# Altium footprint library SMD_Bauteile.PcbLib: 355 footprints (part 14 of 23)
Each footprint in its own frame and in the unit in brackets; x right, y up, seen from the top. Pads: shape width x height; smd on the part's side, far side on the other; paste and mask are expansions set on the pad; w line width, h text height; cw(c..) or ccw(c..) is an arc to the next point about the centre after c.
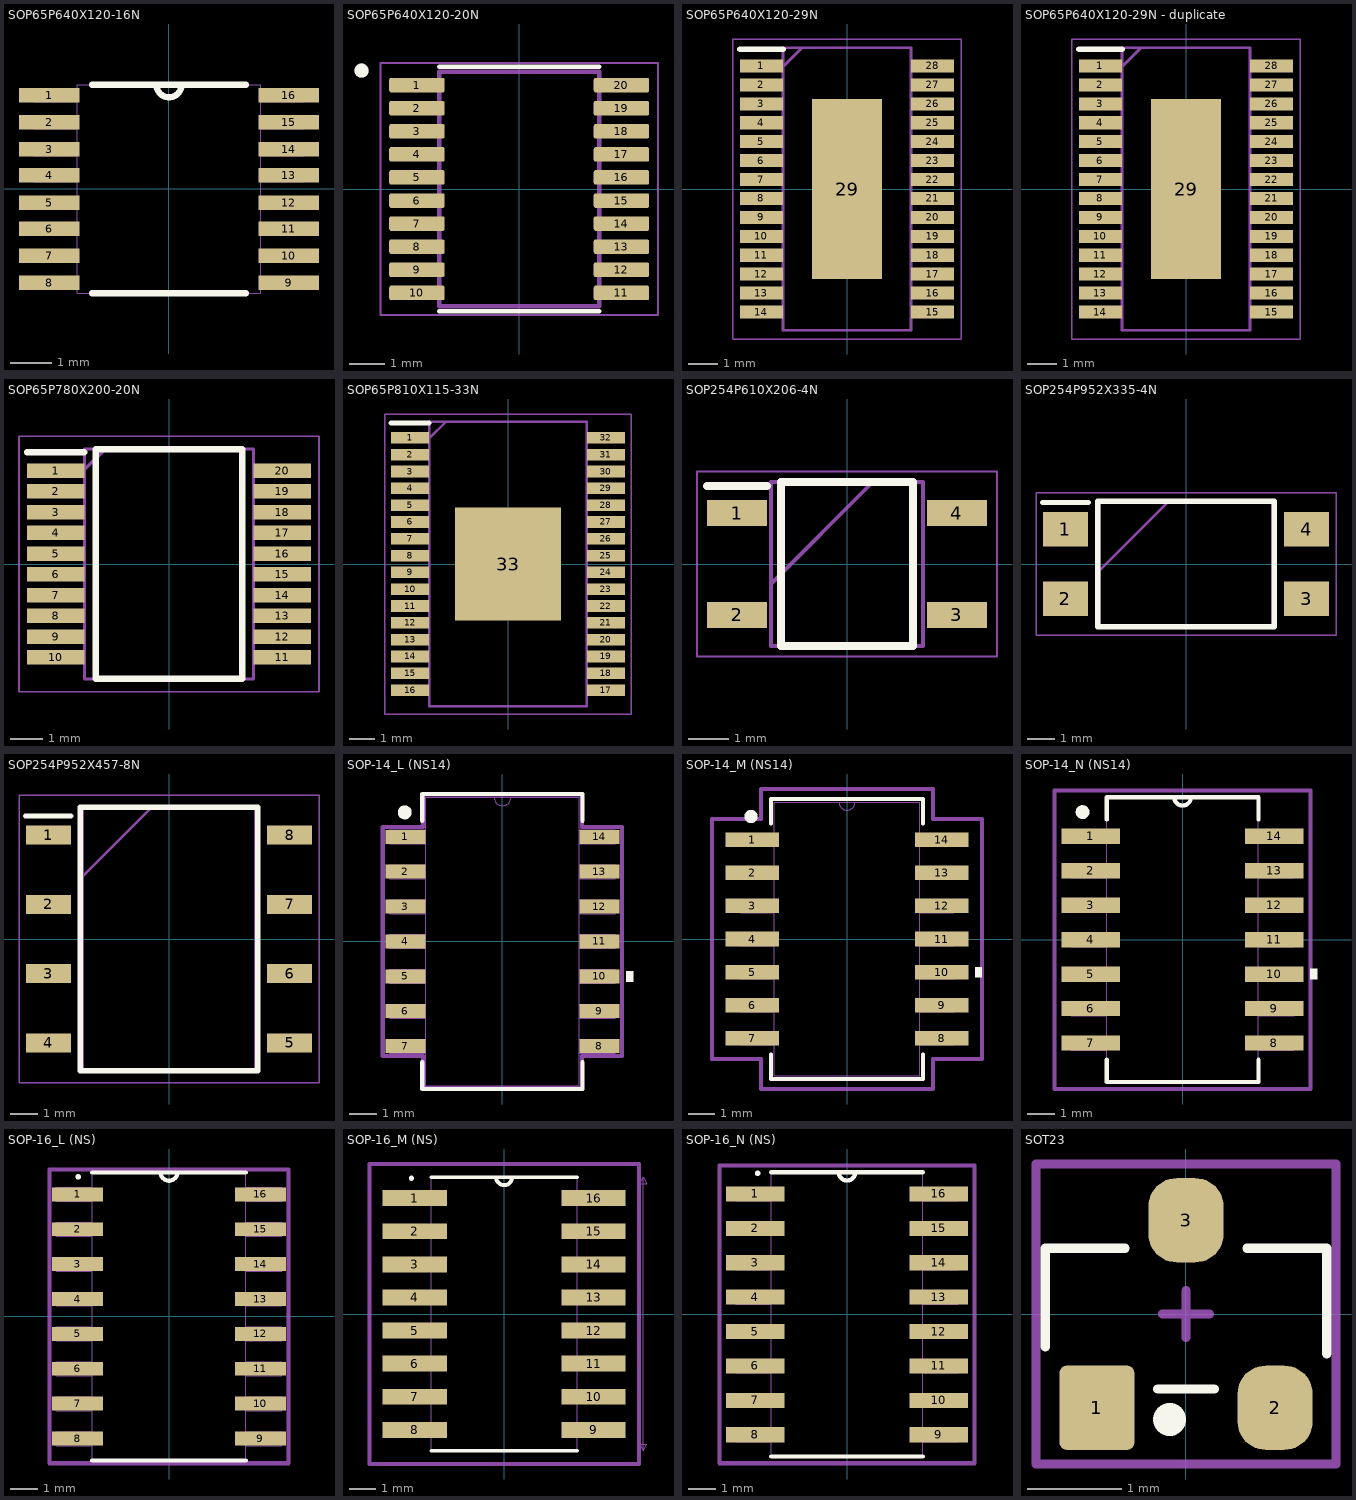
[diagram p13: the footprints below, top view; thin cyan lines are the x and y axes]

## SOP65P640X120-16N [mil]
pads (16):
  rect 58x14 smd: 1(-115,90) 2(-115,64) 3(-115,38) 4(-115,13) 5(-115,-13) 6(-115,-38) 7(-115,-64) 8(-115,-90) 9(115,-90) 10(115,-64) 11(115,-38) 12(115,-13) 13(115,13) 14(115,38) 15(115,64) 16(115,90)
Top Overlay:
  lines w6: -74,-100 74,-100 ; -74,100 -12,100 ; 74,100 12,100 ; -12,100 ccw(c0,100) 12,100 ; -12,100 12,100
Mech Misc 1:
  lines w0: -130,-95 -88,-95 ; -130,-95 -130,-84 ; -130,-95 -88,-95 ; -130,-95 -130,-84 ; -130,-84 -88,-84 ; -130,-84 -88,-84 ; -130,-70 -88,-70 ; -130,-70 -130,-58 ; -130,-70 -88,-70 ; -130,-70 -130,-58 ; -130,-58 -88,-58 ; -130,-58 -88,-58 ; -130,-44 -88,-44 ; -130,-44 -130,-32 ; -130,-44 -88,-44 ; -130,-44 -130,-32 ; -130,-32 -88,-32 ; -130,-32 -88,-32 ; -130,-19 -88,-19 ; -130,-19 -130,-7 ; -130,-19 -88,-19 ; -130,-19 -130,-7 ; -130,-7 -88,-7 ; -130,-7 -88,-7 ; -130,7 -88,7 ; -130,7 -130,19 ; -130,7 -88,7 ; -130,7 -130,19 ; -130,19 -88,19 ; -130,19 -88,19 ; -130,32 -88,32 ; -130,32 -130,44 ; -130,32 -88,32 ; -130,32 -130,44 ; -130,44 -88,44 ; -130,44 -88,44 ; -130,58 -88,58 ; -130,58 -130,70 ; -130,58 -88,58 ; -130,58 -130,70 ; -130,70 -88,70 ; -130,70 -88,70 ; -130,84 -88,84 ; -130,84 -130,95 ; -130,84 -88,84 ; -130,84 -130,95 ; -130,95 -88,95 ; -130,95 -88,95 ; -88,-100 -88,100 ; -88,-100 88,-100 ; -88,-100 -88,100 ; -88,-100 88,-100 ; -88,-95 -88,-84 ; -88,-95 -88,-84 ; -88,-70 -88,-58 ; -88,-70 -88,-58 ; -88,-44 -88,-32 ; -88,-44 -88,-32 ; -88,-19 -88,-7 ; -88,-19 -88,-7 ; -88,7 -88,19 ; -88,7 -88,19 ; -88,32 -88,44 ; -88,32 -88,44 ; -88,58 -88,70 ; -88,58 -88,70 ; -88,84 -88,95 ; -88,84 -88,95 ; -88,100 -12,100 ; -88,100 -12,100 ; -12,100 ccw(c0,100) 12,100 ; -12,100 ccw(c0,100) 12,100 ; -12,100 12,100 ; -12,100 12,100 ; 12,100 88,100 ; 12,100 88,100 ; 88,-100 88,100 ; 88,-100 88,100 ; 88,-95 130,-95 ; 88,-95 88,-84 ; 88,-95 130,-95 ; 88,-95 88,-84 ; 88,-84 130,-84 ; 88,-84 130,-84 ; 88,-70 130,-70 ; 88,-70 88,-58 ; 88,-70 130,-70 ; 88,-70 88,-58 ; 88,-58 130,-58 ; 88,-58 130,-58 ; 88,-44 130,-44 ; 88,-44 88,-32 ; 88,-44 130,-44 ; 88,-44 88,-32 ; 88,-32 130,-32 ; 88,-32 130,-32 ; 88,-19 130,-19 ; 88,-19 88,-7 ; 88,-19 130,-19 ; 88,-19 88,-7 ; 88,-7 130,-7 ; 88,-7 130,-7 ; 88,7 130,7 ; 88,7 88,19 ; 88,7 130,7 ; 88,7 88,19 ; 88,19 130,19 ; 88,19 130,19 ; 88,32 130,32 ; 88,32 88,44 ; 88,32 130,32 ; 88,32 88,44 ; 88,44 130,44 ; 88,44 130,44 ; 88,58 130,58 ; 88,58 88,70 ; 88,58 130,58 ; 88,58 88,70 ; 88,70 130,70 ; 88,70 130,70 ; 88,84 130,84 ; 88,84 88,95 ; 88,84 130,84 ; 88,84 88,95 ; 88,95 130,95 ; 88,95 130,95 ; 130,-95 130,-84 ; 130,-95 130,-84 ; 130,-70 130,-58 ; 130,-70 130,-58 ; 130,-44 130,-32 ; 130,-44 130,-32 ; 130,-19 130,-7 ; 130,-19 130,-7 ; 130,7 130,19 ; 130,7 130,19 ; 130,32 130,44 ; 130,32 130,44 ; 130,58 130,70 ; 130,58 130,70 ; 130,84 130,95 ; 130,84 130,95

## SOP65P640X120-20N [mm]
pads (20):
  rrect25% 1.56x0.41 smd: 1(-2.88,2.925) 2(-2.88,2.275) 3(-2.88,1.625) 4(-2.88,0.975) 5(-2.88,0.325) 6(-2.88,-0.325) 7(-2.88,-0.975) 8(-2.88,-1.625) 9(-2.88,-2.275) 10(-2.88,-2.925) 11(2.88,-2.925) 12(2.88,-2.275) 13(2.88,-1.625) 14(2.88,-0.975) 15(2.88,-0.325) 16(2.88,0.325) 17(2.88,0.975) 18(2.88,1.625) 19(2.88,2.275) 20(2.88,2.925)
Top Overlay:
  circle w0.2: c-4.44,3.335 r0.1
  lines w0.127: -2.25,-3.45 2.25,-3.45 ; -2.25,3.45 2.25,3.45
Mech Misc 1:
  circle w0.2: c-4.44,3.335 r0.1
  lines w0.127: -2.25,-3.3 -2.25,3.3 2.25,3.3 2.25,-3.3 -2.25,-3.3
Mech 15:
  lines w0.05: -3.91,-3.55 -3.91,3.55 3.91,3.55 3.91,-3.55 -3.91,-3.55
3D body "step_temp.STEP": height 1.2, standoff 0, extent -3.2,-3.25 3.2,3.25

## SOP65P640X120-29N [mm]
pads (29):
  rect 1.475x0.45 smd: 1(-2.938,4.225) 2(-2.938,3.575) 3(-2.938,2.925) 4(-2.938,2.275) 5(-2.938,1.625) 6(-2.938,0.975) 7(-2.938,0.325) 8(-2.938,-0.325) 9(-2.938,-0.975) 10(-2.938,-1.625) 11(-2.938,-2.275) 12(-2.938,-2.925) 13(-2.938,-3.575) 14(-2.938,-4.225) 15(2.938,-4.225) 16(2.938,-3.575) 17(2.938,-2.925) 18(2.938,-2.275) 19(2.938,-1.625) 20(2.938,-0.975) 21(2.938,-0.325) 22(2.938,0.325) 23(2.938,0.975) 24(2.938,1.625) 25(2.938,2.275) 26(2.938,2.925) 27(2.938,3.575) 28(2.938,4.225)
  rect 2.4x6.17 smd: 29(0,0)
Top Overlay:
  lines w0.2: -3.675,4.8 -2.2,4.8
Mech 15:
  lines w0.1: -2.2,4.2 -1.55,4.85 ; -2.2,-4.85 2.2,-4.85 2.2,4.85 -2.2,4.85 -2.2,-4.85
Top 3D Body:
  lines w0.05: -3.925,-5.15 3.925,-5.15 3.925,5.15 -3.925,5.15 -3.925,-5.15

## SOP65P640X120-29N - duplicate [mm]
pads (29):
  rect 1.475x0.45 smd: 1(-2.938,4.225) 2(-2.938,3.575) 3(-2.938,2.925) 4(-2.938,2.275) 5(-2.938,1.625) 6(-2.938,0.975) 7(-2.938,0.325) 8(-2.938,-0.325) 9(-2.938,-0.975) 10(-2.938,-1.625) 11(-2.938,-2.275) 12(-2.938,-2.925) 13(-2.938,-3.575) 14(-2.938,-4.225) 15(2.938,-4.225) 16(2.938,-3.575) 17(2.938,-2.925) 18(2.938,-2.275) 19(2.938,-1.625) 20(2.938,-0.975) 21(2.938,-0.325) 22(2.938,0.325) 23(2.938,0.975) 24(2.938,1.625) 25(2.938,2.275) 26(2.938,2.925) 27(2.938,3.575) 28(2.938,4.225)
  rect 2.4x6.17 smd: 29(0,0)
Top Overlay:
  lines w0.2: -3.675,4.8 -2.2,4.8
Mech 15:
  lines w0.1: -2.2,4.2 -1.55,4.85 ; -2.2,-4.85 2.2,-4.85 2.2,4.85 -2.2,4.85 -2.2,-4.85
Top 3D Body:
  lines w0.05: -3.925,-5.15 3.925,-5.15 3.925,5.15 -3.925,5.15 -3.925,-5.15

## SOP65P780X200-20N [mm]
pads (20):
  rect 1.8x0.45 smd: 1(-3.55,2.925) 2(-3.55,2.275) 3(-3.55,1.625) 4(-3.55,0.975) 5(-3.55,0.325) 6(-3.55,-0.325) 7(-3.55,-0.975) 8(-3.55,-1.625) 9(-3.55,-2.275) 10(-3.55,-2.925) 11(3.55,-2.925) 12(3.55,-2.275) 13(3.55,-1.625) 14(3.55,-0.975) 15(3.55,-0.325) 16(3.55,0.325) 17(3.55,0.975) 18(3.55,1.625) 19(3.55,2.275) 20(3.55,2.925)
Top Overlay:
  lines w0.2: -4.45,3.5 -2.65,3.5 ; -2.3,-3.6 -2.3,3.6 2.3,3.6 2.3,-3.6 -2.3,-3.6
Mech 15:
  lines w0.1: -2.65,2.95 -2,3.6 ; -2.65,-3.6 -2.65,3.6 2.65,3.6 2.65,-3.6 -2.65,-3.6
Top 3D Body:
  lines w0.05: -4.7,-4 -4.7,4 4.7,4 4.7,-4 -4.7,-4

## SOP65P810X115-33N [mm]
pads (33):
  rect 1.475x0.45 smd: 1(-3.788,4.875) 2(-3.788,4.225) 3(-3.788,3.575) 4(-3.788,2.925) 5(-3.788,2.275) 6(-3.788,1.625) 7(-3.788,0.975) 8(-3.788,0.325) 9(-3.788,-0.325) 10(-3.788,-0.975) 11(-3.788,-1.625) 12(-3.788,-2.275) 13(-3.788,-2.925) 14(-3.788,-3.575) 15(-3.788,-4.225) 16(-3.788,-4.875) 17(3.788,-4.875) 18(3.788,-4.225) 19(3.788,-3.575) 20(3.788,-2.925) 21(3.788,-2.275) 22(3.788,-1.625) 23(3.788,-0.975) 24(3.788,-0.325) 25(3.788,0.325) 26(3.788,0.975) 27(3.788,1.625) 28(3.788,2.275) 29(3.788,2.925) 30(3.788,3.575) 31(3.788,4.225) 32(3.788,4.875)
  rect 4.11x4.36 smd: 33(0,0)
Top Overlay:
  lines w0.2: -4.525,5.45 -3.05,5.45
Mech 15:
  lines w0.1: -3.05,4.85 -2.4,5.5 ; -3.05,-5.5 3.05,-5.5 3.05,5.5 -3.05,5.5 -3.05,-5.5
Top 3D Body:
  lines w0.05: -4.775,-5.8 4.775,-5.8 4.775,5.8 -4.775,5.8 -4.775,-5.8

## SOP254P610X206-4N [mm]
pads (4):
  rect 1.5x0.65 smd: 1(-2.75,1.27) 2(-2.75,-1.27) 3(2.75,-1.27) 4(2.75,1.27)
Top Overlay:
  lines w0.2: -3.5,1.945 -2,1.945 ; -1.65,-2.044 1.65,-2.044 1.65,2.044 -1.65,2.044 -1.65,-2.044
Mech Misc 1:
  lines w0.1: -1.905,-0.496 0.635,2.044 ; -1.905,-2.044 1.905,-2.044 1.905,2.044 -1.905,2.044 -1.905,-2.044
Mech 15:
  lines w0.05: -3.75,-2.307 3.75,-2.307 3.75,2.307 -3.75,2.307 -3.75,-2.307
3D body "CPC1002N.stp": height 2.05, standoff 0, extent -3.048,-2.044 3.048,2.044

## SOP254P952X335-4N [mm]
pads (4):
  rect 1.65x1.25 smd: 1(-4.4,1.27) 2(-4.4,-1.27) 3(4.4,-1.27) 4(4.4,1.27)
Top Overlay:
  lines w0.2: -5.225,2.245 -3.575,2.245 ; -3.225,-2.286 3.225,-2.286 3.225,2.286 -3.225,2.286 -3.225,-2.286
Mech Misc 1:
  lines w0.1: -3.175,-0.254 -0.635,2.286 ; -3.175,-2.286 3.175,-2.286 3.175,2.286 -3.175,2.286 -3.175,-2.286
Mech 15:
  lines w0.05: -5.475,-2.6 5.475,-2.6 5.475,2.6 -5.475,2.6 -5.475,-2.6
3D body "CPC1301GR.stp": height 3.35, standoff 0, extent -4.763,-2.286 4.763,2.286

## SOP254P952X457-8N [mm]
pads (8):
  rect 1.65x0.7 smd: 1(-4.425,3.81) 2(-4.425,1.27) 3(-4.425,-1.27) 4(-4.425,-3.81) 5(4.425,-3.81) 6(4.425,-1.27) 7(4.425,1.27) 8(4.425,3.81)
Top Overlay:
  lines w0.2: -5.25,4.51 -3.6,4.51 ; -3.25,-4.826 3.25,-4.826 3.25,4.826 -3.25,4.826 -3.25,-4.826
Mech Misc 1:
  lines w0.1: -3.175,2.286 -0.635,4.826 ; -3.175,-4.826 3.175,-4.826 3.175,4.826 -3.175,4.826 -3.175,-4.826
Mech 15:
  lines w0.05: -5.5,-5.266 5.5,-5.266 5.5,5.266 -5.5,5.266 -5.5,-5.266
3D body "LAA710S.stp": height 4.57, standoff 0, extent -4.763,-4.826 4.763,4.826

## SOP-14_L (NS14) [mil]
height 78.74
pads (14):
  rect 57x20 smd paste+0 mask+0: 1(-139,150) 2(-139,100) 3(-139,50) 4(-139,0) 5(-139,-50) 6(-139,-100) 7(-139,-150) 8(139,-150) 9(139,-100) 10(139,-50) 11(139,0) 12(139,50) 13(139,100) 14(139,150)
Top Overlay:
  circle w10: c-140,185 r5
  region: 177.5,-42.5 187.5,-42.5 187.5,-57.5 177.5,-57.5
  lines w6: -115,-173.1 -115,-211.5 115,-211.5 115,-173.1 ; -115,173.1 -115,211.5 115,211.5 115,173.1
Mech Misc 1:
  lines w0: -12,206.5 ccw(c0,206.5) 12,206.5
  lines w1: -161.5,-160 -110,-160 -110,-140 -161.5,-140 -161.5,-160 ; -161.5,-110 -110,-110 -110,-90 -161.5,-90 -161.5,-110 ; -161.5,-60 -110,-60 -110,-40 -161.5,-40 -161.5,-60 ; -161.5,-10 -110,-10 -110,10 -161.5,10 -161.5,-10 ; -161.5,40 -110,40 -110,60 -161.5,60 -161.5,40 ; -161.5,90 -110,90 -110,110 -161.5,110 -161.5,90 ; -161.5,140 -110,140 -110,160 -161.5,160 -161.5,140 ; -110,-206.5 -110,206.5 110,206.5 110,-206.5 -110,-206.5 ; 110,-160 161.5,-160 161.5,-140 110,-140 110,-160 ; 110,-110 161.5,-110 161.5,-90 110,-90 110,-110 ; 110,-60 161.5,-60 161.5,-40 110,-40 110,-60 ; 110,-10 161.5,-10 161.5,10 110,10 110,-10 ; 110,40 161.5,40 161.5,60 110,60 110,40 ; 110,90 161.5,90 161.5,110 110,110 110,90 ; 110,140 161.5,140 161.5,160 110,160 110,140
Mech 15:
  lines w6: -171.5,-164 -114,-164 -114,-210.5 114,-210.5 114,-164 171.5,-164 171.5,164 114,164 114,210.5 -114,210.5 -114,164 -171.5,164 -171.5,-164
3D body: height 10, standoff 0, extent 0,0 10,10
3D body "NS14.step": height 79.09, standoff 0, extent -161.49,-206.49 161.5,206.51

## SOP-14_M (NS14) [mil]
height 78.74
pads (14):
  rect 81x22 smd paste+0 mask+0: 1(-143,150) 2(-143,100) 3(-143,50) 4(-143,0) 5(-143,-50) 6(-143,-100) 7(-143,-150) 8(143,-150) 9(143,-100) 10(143,-50) 11(143,0) 12(143,50) 13(143,100) 14(143,150)
Top Overlay:
  circle w10: c-145,185 r5
  region: 193.5,-42.5 203.5,-42.5 203.5,-57.5 193.5,-57.5
  lines w6: -115,-174.1 -115,-211.5 115,-211.5 115,-174.1 ; -115,174.1 -115,211.5 115,211.5 115,174.1
Mech Misc 1:
  lines w0: -12,206.5 ccw(c0,206.5) 12,206.5
  lines w1: -161.5,-160 -161.5,-140 -110,-140 -110,-160 -161.5,-160 ; -161.5,-110 -161.5,-90 -110,-90 -110,-110 -161.5,-110 ; -161.5,-60 -161.5,-40 -110,-40 -110,-60 -161.5,-60 ; -161.5,-10 -161.5,10 -110,10 -110,-10 -161.5,-10 ; -161.5,40 -161.5,60 -110,60 -110,40 -161.5,40 ; -161.5,90 -161.5,110 -110,110 -110,90 -161.5,90 ; -161.5,140 -161.5,160 -110,160 -110,140 -161.5,140 ; -110,-206.5 110,-206.5 110,206.5 -110,206.5 -110,-206.5 ; 110,-160 110,-140 161.5,-140 161.5,-160 110,-160 ; 110,-110 110,-90 161.5,-90 161.5,-110 110,-110 ; 110,-60 110,-40 161.5,-40 161.5,-60 110,-60 ; 110,-10 110,10 161.5,10 161.5,-10 110,-10 ; 110,40 110,60 161.5,60 161.5,40 110,40 ; 110,90 110,110 161.5,110 161.5,90 110,90 ; 110,140 110,160 161.5,160 161.5,140 110,140
Mech 15:
  lines w6: -203.5,-181 -203.5,181 -130,181 -130,226.5 130,226.5 130,181 203.5,181 203.5,-181 130,-181 130,-226.5 -130,-226.5 -130,-181 -203.5,-181
3D body: height 10, standoff 0, extent 0,0 10,10
3D body "NS14.step": height 79.09, standoff 0, extent -161.49,-206.49 161.5,206.5

## SOP-14_N (NS14) [mil]
height 78.74
pads (14):
  rect 85x22 smd: 1(-133,150) 2(-133,100) 3(-133,50) 4(-133,0) 5(-133,-50) 6(-133,-100) 7(-133,-150) 8(133,-150) 9(133,-100) 10(133,-50) 11(133,0) 12(133,50) 13(133,100) 14(133,150)
Top Overlay:
  circle w10: c-145,185 r5
  region: 185.5,-42.5 195.5,-42.5 195.5,-57.5 185.5,-57.5
  lines w6: -110,-174.1 -110,-206.5 110,-206.5 110,-174.1 ; -110,174.1 -110,206.5 110,206.5 110,174.1 ; -12,206.5 ccw(c0,206.5) 12,206.5
Mech Misc 1:
  lines w0: -12,206.5 ccw(c0,206.5) 12,206.5
  lines w1: -161.5,-160 -161.5,-140 -110,-140 -110,-160 -161.5,-160 ; -161.5,-110 -161.5,-90 -110,-90 -110,-110 -161.5,-110 ; -161.5,-60 -161.5,-40 -110,-40 -110,-60 -161.5,-60 ; -161.5,-10 -161.5,10 -110,10 -110,-10 -161.5,-10 ; -161.5,40 -161.5,60 -110,60 -110,40 -161.5,40 ; -161.5,90 -161.5,110 -110,110 -110,90 -161.5,90 ; -161.5,140 -161.5,160 -110,160 -110,140 -161.5,140 ; -110,-206.5 110,-206.5 110,206.5 -110,206.5 -110,-206.5 ; 110,-160 110,-140 161.5,-140 161.5,-160 110,-160 ; 110,-110 110,-90 161.5,-90 161.5,-110 110,-110 ; 110,-60 110,-40 161.5,-40 161.5,-60 110,-60 ; 110,-10 110,10 161.5,10 161.5,-10 110,-10 ; 110,40 110,60 161.5,60 161.5,40 110,40 ; 110,90 110,110 161.5,110 161.5,90 110,90 ; 110,140 110,160 161.5,160 161.5,140 110,140
Mech 15:
  lines w6: -185.5,-216.5 -185.5,216.5 185.5,216.5 185.5,-216.5 -185.5,-216.5
3D body: height 10, standoff 0, extent 0,0 10,10
3D body "NS14.step": height 79.09, standoff 0, extent -161.5,-206.49 161.5,206.5

## SOP-16_L (NS) [mil]
height 78.74
pads (16):
  rect 73x20 smd: 1(-131,175) 2(-131,125) 3(-131,75) 4(-131,25) 5(-131,-25) 6(-131,-75) 7(-131,-125) 8(-131,-175) 9(131,-175) 10(131,-125) 11(131,-75) 12(131,-25) 13(131,25) 14(131,75) 15(131,125) 16(131,175)
Top Overlay:
  circle w7.87: c-130,200 r0.1
  lines w6: -110,-206.5 110,-206.5 ; -110,206.5 110,206.5 ; -12,206.5 ccw(c0,206.5) 12,206.5
Mech Misc 1:
  lines w0: -12,206.5 ccw(c0,206.5) 12,206.5
  lines w1: -161.5,-185 -110,-185 -110,-165 -161.5,-165 -161.5,-185 ; -161.5,-135 -110,-135 -110,-115 -161.5,-115 -161.5,-135 ; -161.5,-85 -110,-85 -110,-65 -161.5,-65 -161.5,-85 ; -161.5,-35 -110,-35 -110,-15 -161.5,-15 -161.5,-35 ; -161.5,15 -110,15 -110,35 -161.5,35 -161.5,15 ; -161.5,65 -110,65 -110,85 -161.5,85 -161.5,65 ; -161.5,115 -110,115 -110,135 -161.5,135 -161.5,115 ; -161.5,165 -110,165 -110,185 -161.5,185 -161.5,165 ; -110,-206.5 -110,206.5 110,206.5 110,-206.5 -110,-206.5 ; 110,-185 161.5,-185 161.5,-165 110,-165 110,-185 ; 110,-135 161.5,-135 161.5,-115 110,-115 110,-135 ; 110,-85 161.5,-85 161.5,-65 110,-65 110,-85 ; 110,-35 161.5,-35 161.5,-15 110,-15 110,-35 ; 110,15 161.5,15 161.5,35 110,35 110,15 ; 110,65 161.5,65 161.5,85 110,85 110,65 ; 110,115 161.5,115 161.5,135 110,135 110,115 ; 110,165 161.5,165 161.5,185 110,185 110,165
Mech 15:
  lines w6: -171.5,-210.5 171.5,-210.5 171.5,210.5 -171.5,210.5 -171.5,-210.5
3D body "SOP-16 (NS).stp": height 78.74, standoff 0, extent -153.54,-200.78 153.55,200.79
3D body: height 10, standoff 0, extent 0,0 10,10

## SOP-16_M (NS) [mil]
height 78.74
pads (16):
  rect 97x24 smd: 1(-135,175) 2(-135,125) 3(-135,75) 4(-135,25) 5(-135,-25) 6(-135,-75) 7(-135,-125) 8(-135,-175) 9(135,-175) 10(135,-125) 11(135,-75) 12(135,-25) 13(135,25) 14(135,75) 15(135,125) 16(135,175)
Top Overlay:
  circle w7.87: c-140,205 r0.1
  lines w6: -110,-206.5 110,-206.5 ; -110,206.5 110,206.5 ; -12,206.5 ccw(c0,206.5) 12,206.5
Top Courtyard:
  lines w1: 210,-206.5 210,206.5 ; 210,-206.5 205,-196.5 215,-196.5 210,-206.5 ; 210,206.5 205,196.5 215,196.5 210,206.5
Mech Misc 1:
  lines w0: -12,206.5 ccw(c0,206.5) 12,206.5
  lines w1: -161.5,-185 -161.5,-165 -110,-165 -110,-185 -161.5,-185 ; -161.5,-135 -161.5,-115 -110,-115 -110,-135 -161.5,-135 ; -161.5,-85 -161.5,-65 -110,-65 -110,-85 -161.5,-85 ; -161.5,-35 -161.5,-15 -110,-15 -110,-35 -161.5,-35 ; -161.5,15 -161.5,35 -110,35 -110,15 -161.5,15 ; -161.5,65 -161.5,85 -110,85 -110,65 -161.5,65 ; -161.5,115 -161.5,135 -110,135 -110,115 -161.5,115 ; -161.5,165 -161.5,185 -110,185 -110,165 -161.5,165 ; -110,-206.5 110,-206.5 110,206.5 -110,206.5 -110,-206.5 ; 110,-185 110,-165 161.5,-165 161.5,-185 110,-185 ; 110,-135 110,-115 161.5,-115 161.5,-135 110,-135 ; 110,-85 110,-65 161.5,-65 161.5,-85 110,-85 ; 110,-35 110,-15 161.5,-15 161.5,-35 110,-35 ; 110,15 110,35 161.5,35 161.5,15 110,15 ; 110,65 110,85 161.5,85 161.5,65 110,65 ; 110,115 110,135 161.5,135 161.5,115 110,115 ; 110,165 110,185 161.5,185 161.5,165 110,165
Mech 15:
  lines w6: -203.5,-226.5 -203.5,226.5 203.5,226.5 203.5,-226.5 -203.5,-226.5
3D body "SOP-16 (NS).stp": height 78.74, standoff 0, extent -153.54,-200.78 153.55,200.79
3D body: height 10, standoff 0, extent 0,0 10,10

## SOP-16_N (NS) [mil]
height 78.74
pads (16):
  rect 85x22 smd: 1(-133,175) 2(-133,125) 3(-133,75) 4(-133,25) 5(-133,-25) 6(-133,-75) 7(-133,-125) 8(-133,-175) 9(133,-175) 10(133,-125) 11(133,-75) 12(133,-25) 13(133,25) 14(133,75) 15(133,125) 16(133,175)
Top Overlay:
  circle w7.87: c-130,205 r0.1
  lines w6: -110,-206.5 110,-206.5 ; -110,206.5 110,206.5 ; -12,206.5 ccw(c0,206.5) 12,206.5
Mech Misc 1:
  lines w0: -12,206.5 ccw(c0,206.5) 12,206.5
  lines w1: -161.5,-185 -110,-185 -110,-165 -161.5,-165 -161.5,-185 ; -161.5,-135 -110,-135 -110,-115 -161.5,-115 -161.5,-135 ; -161.5,-85 -110,-85 -110,-65 -161.5,-65 -161.5,-85 ; -161.5,-35 -110,-35 -110,-15 -161.5,-15 -161.5,-35 ; -161.5,15 -110,15 -110,35 -161.5,35 -161.5,15 ; -161.5,65 -110,65 -110,85 -161.5,85 -161.5,65 ; -161.5,115 -110,115 -110,135 -161.5,135 -161.5,115 ; -161.5,165 -110,165 -110,185 -161.5,185 -161.5,165 ; -110,-206.5 -110,206.5 110,206.5 110,-206.5 -110,-206.5 ; 110,-185 161.5,-185 161.5,-165 110,-165 110,-185 ; 110,-135 161.5,-135 161.5,-115 110,-115 110,-135 ; 110,-85 161.5,-85 161.5,-65 110,-65 110,-85 ; 110,-35 161.5,-35 161.5,-15 110,-15 110,-35 ; 110,15 161.5,15 161.5,35 110,35 110,15 ; 110,65 161.5,65 161.5,85 110,85 110,65 ; 110,115 161.5,115 161.5,135 110,135 110,115 ; 110,165 161.5,165 161.5,185 110,185 110,165
Mech 15:
  lines w6: -185.5,-216.5 185.5,-216.5 185.5,216.5 -185.5,216.5 -185.5,-216.5
3D body: height 10, standoff 0, extent 0,0 10,10
3D body "SOP-16 (NS).stp": height 78.74, standoff 0, extent -153.54,-200.78 153.55,200.79

## SOT23 [mm] "generischer SOT23 Footpint"
height 1.5
pads (3):
  rrect20% 0.8x0.9 smd: 1(-0.95,-1)
  rrect75% 0.8x0.9 smd: 2(0.95,-1) 3(0,1)
Top Overlay:
  circle w0.25: c-0.175,-1.125 r0.05
  lines w0.1: -1.5,-0.35 -1.5,0.7 -0.65,0.7 ; -0.3,-0.8 0.3,-0.8 ; 0.65,0.7 1.5,0.7 1.5,-0.425
Top Component Center:
  lines w0.1: -0.25,0 0.25,0 ; 0,-0.25 0,0.25
Top Courtyard (Mech26):
  lines w0.1: -1.6,-1.6 1.6,-1.6 1.6,1.6 -1.6,1.6 -1.6,-1.6
3D body "sot23_noname.stp": height 1.05, standoff -0.01, extent -1.5,-1.25 1.5,1.25